# Altium footprint library Sajad_Altium_Library.PcbLib: 380 footprints (part 7 of 24)
Each footprint in its own frame and in the unit in brackets; x right, y up, seen from the top. Pads: shape width x height; smd on the part's side, far side on the other; paste and mask are expansions set on the pad; w line width, h text height; cw(c..) or ccw(c..) is an arc to the next point about the centre after c.
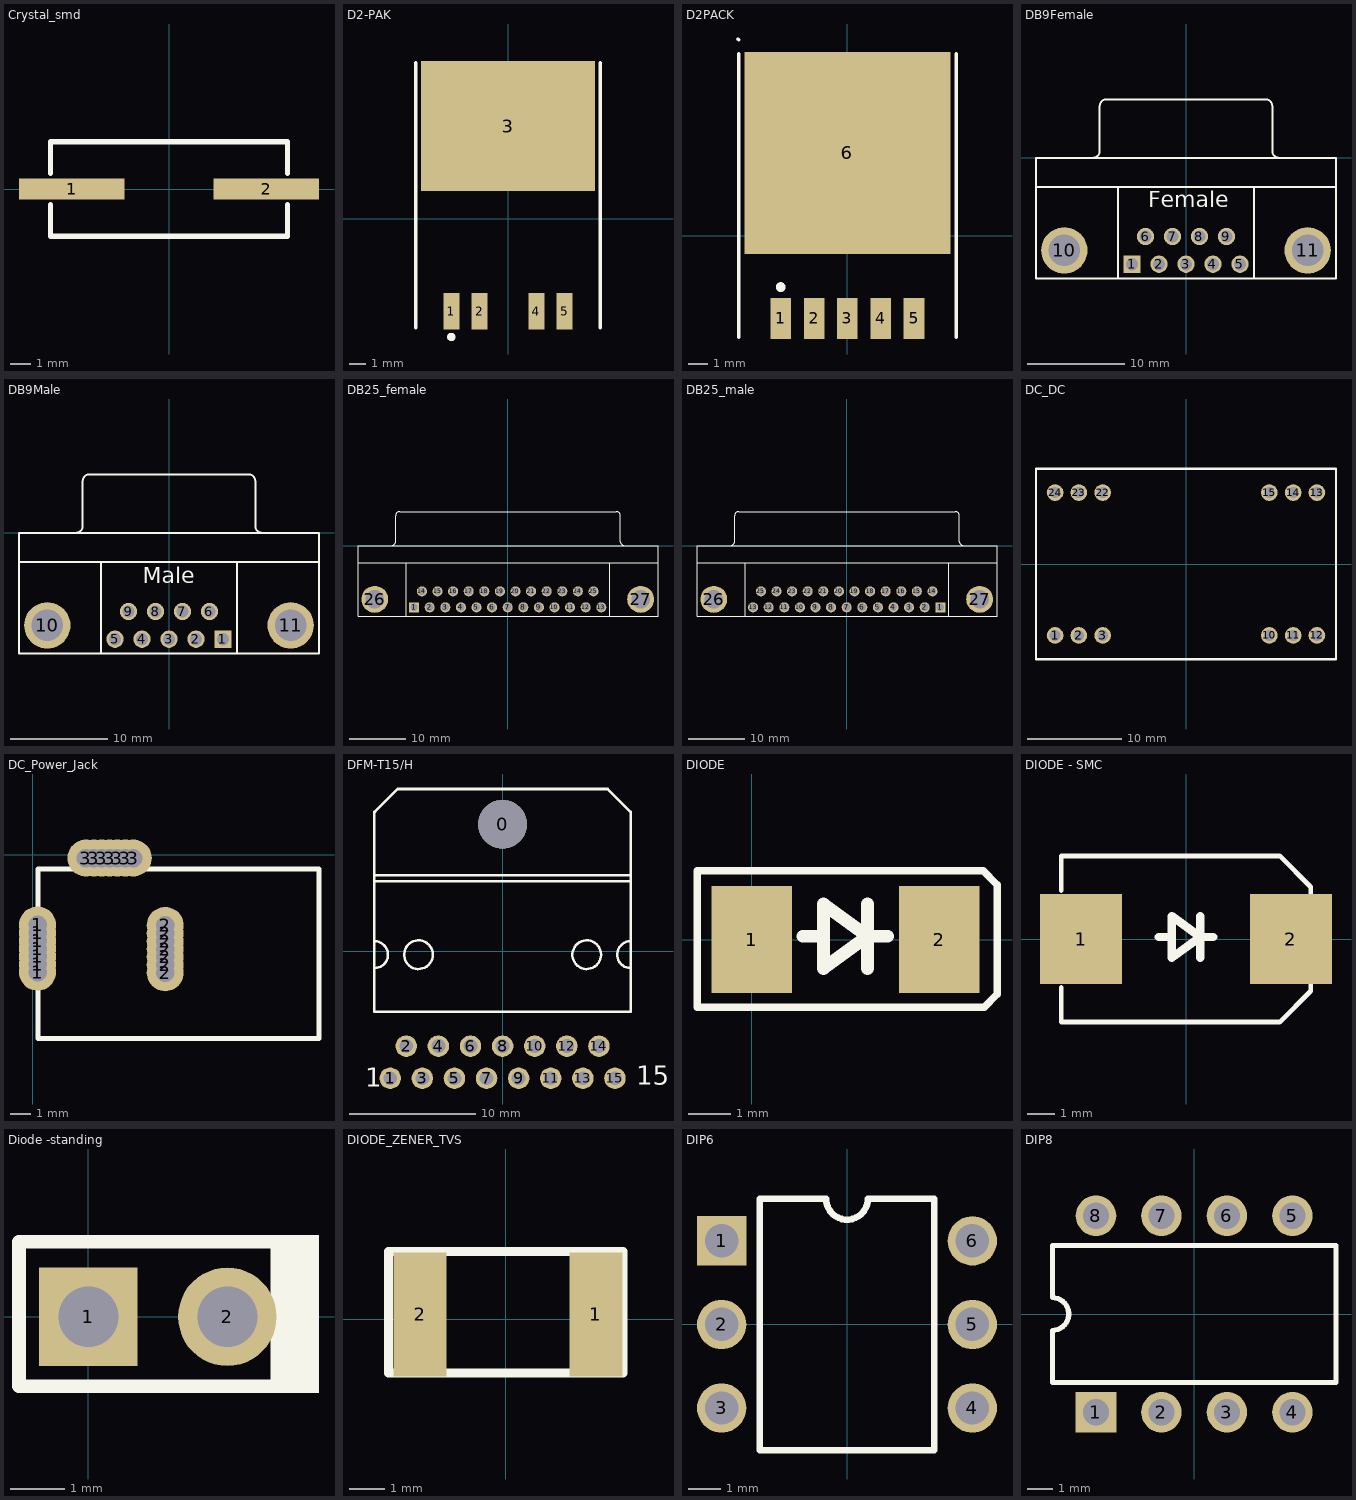
[diagram p6: the footprints below, top view; thin cyan lines are the x and y axes]

## Crystal_smd [mil] "16 Mhz Crystal footprint"
pads (2):
  rect 200x40 smd: 1(-185,0) 2(185,0)
Top Overlay:
  lines w10: -225,-30 -225,-90 0,-90 225,-90 225,-30 ; -225,30 -225,90 0,90 225,90 225,30
3D body: height 162.17, standoff 4.69, extent -246.43,-94.48 245.7,94.5

## D2-PAK [mm] "D2-PAK; 5 Leads (1 Cropped); Body 15.3 (inc. leads) x 10.4 mm (LxW max)"
height 4.55
pads (5):
  rect 0.95x2.2 smd: 1(-3.4,-5.55) 2(-1.7,-5.55) 4(1.7,-5.55) 5(3.4,-5.55)
  rect 10.45x7.8 smd: 3(0,5.55)
Top Overlay:
  circle w0.25: c-3.4,-7.1 r0.125
  lines w0.2: -5.525,-6.55 -5.525,9.35 ; 5.525,-6.55 5.525,9.35

## D2PACK [mm]
pads (6):
  rect 1.05x2.1 smd: 1(-3.4,-4.225) 2(-1.7,-4.225) 3(0,-4.225) 4(1.7,-4.225) 5(3.4,-4.225)
  rect 10.5x10.3 smd: 6(0,4.225)
Top Overlay:
  circle w0.25: c-3.4,-2.625 r0.125
  lines w0.178: -5.588,10.033 -5.55,9.995 ; -5.55,-5.175 -5.55,9.275 ; 5.55,-5.175 5.55,9.275

## DB9Female [mm] "DB9 Serial Connector"
pads (11):
  rect 1.778x1.778 hole 1.27: 1(-5.54,-10.92)
  round 1.778 hole 1.27: 2(-2.77,-10.92) 3(0,-10.92) 4(2.77,-10.92) 5(5.54,-10.92) 6(-4.155,-8.08) 7(-1.385,-8.08) 8(1.385,-8.08) 9(4.155,-8.08)
  round 4.76 hole 3.26: 10(-12.495,-9.5) 11(12.495,-9.5)
Top Overlay:
  lines w0.2: -15.4,-3 15.4,-3 ; -9.56,0.005 ccw(c-9.56,0.7) -8.865,0.7 -8.865,5.3 ; -8.86,5.305 cw(c-8.165,5.305) -8.165,6 8.165,6 cw(c8.165,5.305) 8.86,5.305 ; -7,-12.4 -7,-3 ; 7,-12.4 7,-3 ; 8.865,5.3 8.865,0.7 ccw(c9.56,0.7) 9.56,0.005 ; -15.4,-12.4 15.4,-12.4 15.4,0 -15.4,0 -15.4,-12.4
  text "Female" at -3.861,-5.613 h2.79
3D body: height 12.62, standoff -4.25, extent -15.43,-12.624 15.38,8.176

## DB9Male [mm] "DB9 Serial Connector"
pads (11):
  rect 1.778x1.778 hole 1.27: 1(5.54,-10.92)
  round 1.778 hole 1.27: 2(2.77,-10.92) 3(0,-10.92) 4(-2.77,-10.92) 5(-5.54,-10.92) 6(4.155,-8.08) 7(1.385,-8.08) 8(-1.385,-8.08) 9(-4.155,-8.08)
  round 4.76 hole 3.26: 10(-12.495,-9.5) 11(12.495,-9.5)
Top Overlay:
  lines w0.2: -15.4,-3 15.4,-3 ; -9.56,0.005 ccw(c-9.56,0.7) -8.865,0.7 -8.865,5.3 ; -8.86,5.305 cw(c-8.165,5.305) -8.165,6 8.165,6 cw(c8.165,5.305) 8.86,5.305 ; -7,-12.4 -7,-3 ; 7,-12.4 7,-3 ; 8.865,5.3 8.865,0.7 ccw(c9.56,0.7) 9.56,0.005 ; -15.4,-12.4 15.4,-12.4 15.4,0 -15.4,0 -15.4,-12.4
  text "Male" at -2.692,-5.74 h2.79
3D body: height 11.25, standoff -5.15, extent -15.225,-12.818 15.275,4.882

## DB25_female [mil] "Connector; D Subminiature; 25 Position; Right Angle; Pitch 1.385 mm"
height 509.06
pads (27):
  rect 70x70 hole 50: 1(-652.2,-429.92)
  round 70 hole 50: 2(-543.5,-429.92) 3(-434.8,-429.92) 4(-326.1,-429.92) 5(-217.4,-429.92) 6(-108.7,-429.92) 7(0,-429.92) 8(108.7,-429.92) 9(217.4,-429.92) 10(326.1,-429.92) 11(434.8,-429.92) 12(543.5,-429.92) 13(652.2,-429.92) 14(-597.85,-318.11) 15(-489.15,-318.11) 16(-380.45,-318.11) 17(-271.75,-318.11) 18(-163.05,-318.11) 19(-54.35,-318.11) 20(54.35,-318.11) 21(163.05,-318.11) 22(271.75,-318.11) 23(380.45,-318.11) 24(489.15,-318.11) 25(597.85,-318.11)
  round 187.4 hole 128.35: 26(-926.22,-374.02) 27(926.22,-374.02)
Top Overlay:
  lines w7.87: -1043.15,-118.11 1047.4,-118.11 ; -808.7,0.2 ccw(c-808.7,27.56) -781.34,27.56 -781.34,208.66 ; -781.14,208.86 cw(c-753.78,208.86) -753.78,236.22 758.03,236.22 cw(c758.03,208.86) 785.39,208.86 ; -706.54,-492.13 -706.54,-118.11 ; 710.79,-492.13 710.79,-118.11 ; 785.59,208.66 785.59,27.56 ccw(c812.95,27.56) 812.95,0.2 ; -1043.15,-492.13 -1043.15,0 1047.4,0 1047.4,-492.13 -1043.15,-492.13
3D body: height 500, standoff -177.17, extent -1055.99,-492.68 1049.12,231.73

## DB25_male [mil] "Connector; D Subminiature; 25 Position; Right Angle; Pitch 1.385 mm"
height 509.06
pads (27):
  rect 70x70 hole 50: 1(652.2,-429.92)
  round 70 hole 50: 2(543.5,-429.92) 3(434.8,-429.92) 4(326.1,-429.92) 5(217.4,-429.92) 6(108.7,-429.92) 7(0,-429.92) 8(-108.7,-429.92) 9(-217.4,-429.92) 10(-326.1,-429.92) 11(-434.8,-429.92) 12(-543.5,-429.92) 13(-652.2,-429.92) 14(597.85,-318.11) 15(489.15,-318.11) 16(380.45,-318.11) 17(271.75,-318.11) 18(163.05,-318.11) 19(54.35,-318.11) 20(-54.35,-318.11) 21(-163.05,-318.11) 22(-271.75,-318.11) 23(-380.45,-318.11) 24(-489.15,-318.11) 25(-597.85,-318.11)
  round 187.4 hole 128.35: 26(-926.22,-374.02) 27(926.22,-374.02)
Top Overlay:
  lines w7.87: -1043.15,-118.11 1047.4,-118.11 ; -808.7,0.2 ccw(c-808.7,27.56) -781.34,27.56 -781.34,208.66 ; -781.14,208.86 cw(c-753.78,208.86) -753.78,236.22 758.03,236.22 cw(c758.03,208.86) 785.39,208.86 ; -706.54,-492.13 -706.54,-118.11 ; 710.79,-492.13 710.79,-118.11 ; 785.59,208.66 785.59,27.56 ccw(c812.95,27.56) 812.95,0.2 ; -1043.15,-492.13 1047.4,-492.13 1047.4,0 -1043.15,0 -1043.15,-492.13
3D body: height 500, standoff -177.17, extent -1055.99,-492.68 1049.12,231.73

## DC_DC [mil] "dc to dc footprint"
pads (12):
  round 70 hole 45: 1(-550,-300) 2(-450,-300) 3(-350,-300) 10(350,-300) 11(450,-300) 12(550,-300) 13(550,300) 14(450,300) 15(350,300) 22(-350,300) 23(-450,300) 24(-550,300)
Top Overlay:
  lines w10: -630,-400 -630,400 630,400 630,-400 -630,-400

## DC_Power_Jack [mil]
height 500
pads (21):
  round 70 hole 35: 1(9.33,-221.81) 1(9.33,-206.81) 1(9.33,-191.81) 1(9.33,-177.17) 1(9.33,-162.52) 1(9.33,-147.52) 1(9.33,-132.52) 2(250.31,-222.79) 2(250.31,-207.79) 2(250.31,-192.79) 2(250.31,-178.15) 2(250.31,-163.5) 2(250.31,-148.5) 2(250.31,-133.5) 3(100.71,-6.3) 3(115.71,-6.3) 3(130.71,-6.3) 3(145.35,-6.3) 3(160,-6.3) 3(175,-6.3) 3(190,-6.3)
Top Overlay:
  lines w10: 10.31,-346.97 10.31,-26.97 540.67,-26.97 540.67,-346.97 10.31,-346.97
3D body: height 433.07, standoff -200.79, extent -15,-367.91 555.87,17.91

## DFM-T15/H [mm] "TO, Thru-Hole, Horizontal, Heatsink Mounted; 15 Bent Staggered Leads; Pitch 1.27 mm"
height 4.62
pads (16):
  round 3.86 hole 3.86: 0(0,10.045)
  round 1.7 hole 1.1: 1(-8.89,-10.045) 2(-7.62,-7.505) 3(-6.35,-10.045) 4(-5.08,-7.505) 5(-3.81,-10.045) 6(-2.54,-7.505) 7(-1.27,-10.045) 8(0,-7.505) 9(1.27,-10.045) 10(2.54,-7.505) 11(3.81,-10.045) 12(5.08,-7.505) 13(6.35,-10.045) 14(7.62,-7.505) 15(8.89,-10.045)
Top Overlay:
  circle w0.2: c-6.656,-0.271 r1.136
  circle w0.2: c6.656,-0.271 r1.136
  lines w0.2: -10.135,-1.336 ccw(c-10.135,-0.271) -10.135,0.795 ; -10.135,5.555 10.135,5.555 ; -10.135,6.025 10.135,6.025 ; -10.135,11.05 -10.135,11.045 -10.135,-4.794 10.135,-4.795 10.135,11.045 ; -10.09,11.045 -8.3,12.836 8.3,12.836 10.09,11.045 ; 10.135,-1.336 cw(c10.135,-0.271) 10.135,0.795
  text "15" at 10.554,-10.556 h1.5
  text "1" at -10.863,-10.731 h1.5
3D body: height 5, standoff -1.5, extent -9.796,-10.301 9.804,13.299

## DIODE [mm] "1N4001-7"
pads (2):
  rect 1.905x2.54 smd: 1(0,0) 2(4.445,0)
Top Overlay:
  lines w0.178: -1.295,-1.6 -1.295,1.626 3.404,1.626 5.486,1.626 5.817,1.295 5.817,-1.295 5.512,-1.6 3.378,-1.6 -1.295,-1.6
  lines w0.305: 2.743,-0.686 2.743,0.838 ; 3.226,0.076 2.743,0.076 ; 2.743,0.076 1.702,0.838 1.702,-0.686 2.743,0.076 ; 1.219,0.076 1.702,0.076 1.219,0.076

## DIODE - SMC [mm]
pads (2):
  rect 3x3.302 smd: 1(-3.847,0) 2(3.847,0)
Top Overlay:
  lines w0.178: -4.572,-1.778 -4.572,-3.048 3.429,-3.048 4.572,-1.905 4.572,-1.651 ; -4.572,1.778 -4.572,3.048 3.429,3.048 4.572,1.905 4.572,1.651
  lines w0.305: 0.521,-0.686 0.521,0.838 ; 1.003,0.076 0.521,0.076 ; 0.521,0.076 -0.521,-0.686 -0.521,0.838 0.521,0.076 ; -1.003,0.076 -0.521,0.076 -1.003,0.076
3D body: height 4.4, standoff 1.95, extent -3.9,-2.95 3.9,2.95

## Diode -standing [mm] "Axial"
height 6.5
pads (2):
  rect 1.8x1.8 hole 1.1: 1(0,0)
  round 1.8 hole 1.1: 2(2.54,0)
Top Overlay:
  rectangle: 3.327,-1.397 4.216,1.499
  lines w0.254: -1.245,1.372 -1.27,1.372 ; 3.556,-1.27 -1.27,-1.27 -1.27,1.372 ; 3.556,1.372 -1.27,1.372
3D body: height 6.49, standoff -1.91, extent -0.394,-1.333 3.874,1.334

## DIODE_ZENER_TVS [mm]
height 0.55
pads (2):
  rect 1.5x3.5 smd: 1(2.54,0.127) 2(-2.413,0.127)
Top Overlay:
  lines w0.254: -3.302,-1.524 3.302,-1.524 3.302,1.905 -3.302,1.905 -3.302,-1.524

## DIP6 [mm] "DIP; 6 Leads; Row Spacing 7.62 mm; Pitch 2.54 mm"
height 5.6
pads (6):
  rect 1.5x1.5 hole 1.016: 1(-3.81,2.54)
  round 1.5 hole 1.016: 2(-3.81,0) 3(-3.81,-2.54) 4(3.81,-2.54) 5(3.81,0) 6(3.81,2.54)
Top Overlay:
  lines w0.2: -2.65,-3.82 -2.65,3.82 -0.635,3.82 ccw(c0,3.82) 0.635,3.82 2.65,3.82 2.65,-3.82 -2.65,-3.82

## DIP8 [mil] "DIP; 8 Leads; Row Spacing 7.62 mm; Pitch 2.54 mm"
height 200
pads (8):
  rect 62x62 hole 40: 1(-150,-150)
  round 62 hole 40: 2(-50,-150) 3(50,-150) 4(150,-150) 5(150,150) 6(50,150) 7(-50,150) 8(-150,150)
Top Overlay:
  lines w7.87: -216.53,-104.33 -216.53,-25 ccw(c-216.53,0) -216.53,25 -216.53,104.33 216.53,104.33 216.53,-104.33 -216.53,-104.33
3D body: height 200, standoff -137.8, extent -219.96,-153.84 209.96,156